# Altium footprint library En.PcbLib: 240 footprints (part 5 of 15)
Each footprint in its own frame and in the unit in brackets; x right, y up, seen from the top. Pads: shape width x height; smd on the part's side, far side on the other; paste and mask are expansions set on the pad; w line width, h text height; cw(c..) or ccw(c..) is an arc to the next point about the centre after c.
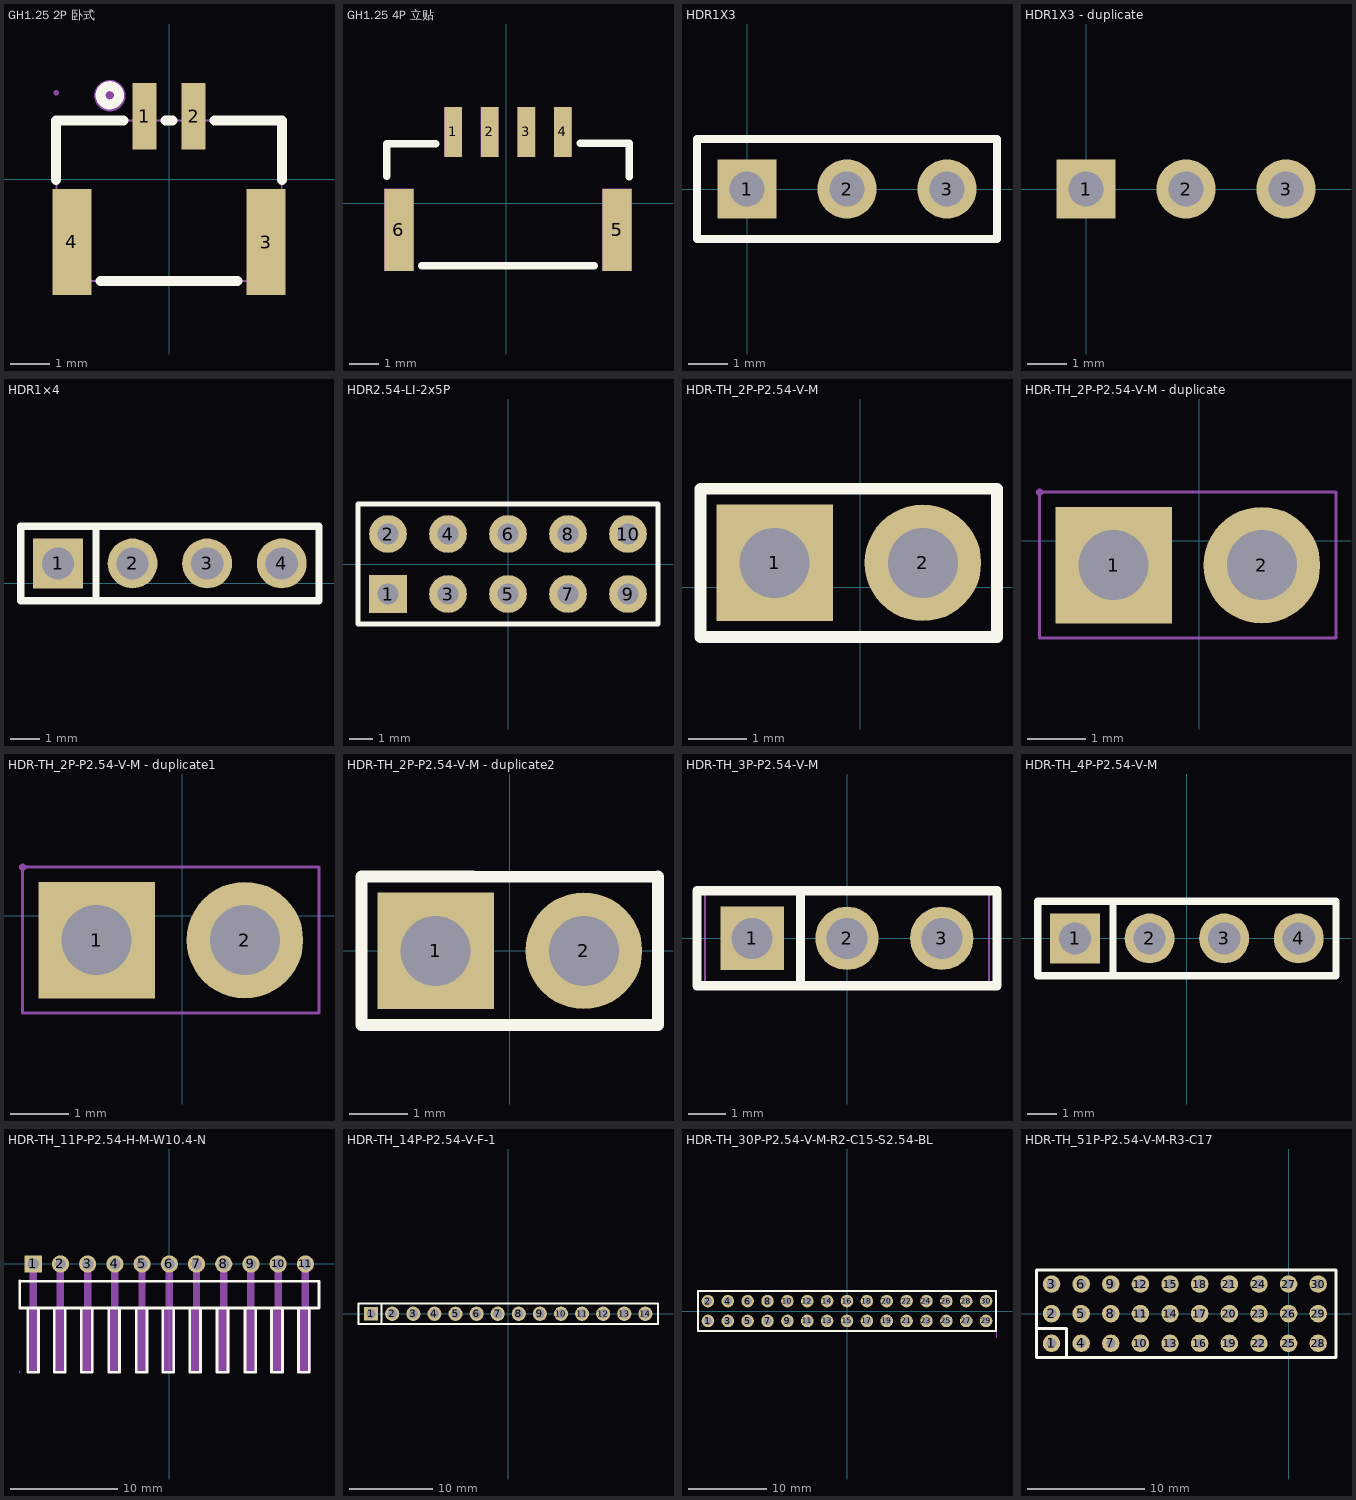
[diagram p4: the footprints below, top view; thin cyan lines are the x and y axes]

## GH1.25 2P 卧式 [mm]
pads (4):
  rect 0.6x1.7 smd mask+0.051: 1(-0.625,1.602) 2(0.625,1.602)
  rect 1x2.7 smd mask+0.051: 3(2.475,-1.602) 4(-2.475,-1.598)
Top Overlay:
  circle w0.254: c-1.51,2.14 r0.233
  lines w0.254: -2.88,-0.017 -2.88,1.5 -1.156,1.5 ; -1.744,-2.6 1.744,-2.6 ; -0.094,1.5 0.094,1.5 ; 1.156,1.5 2.88,1.5 2.88,-0.021
Mechanical 6:
  circle w0.4: c-1.51,2.13 r0.2
Mechanical 15:
  region: -2.575,-0.598 -2.375,-0.598 -2.375,-2.598 -2.575,-2.598
  region: 2.375,-0.602 2.575,-0.602 2.575,-2.602 2.375,-2.602
  region: -0.725,2.202 -0.525,2.202 -0.525,1.002 -0.725,1.002
  region: 0.525,2.202 0.725,2.202 0.725,1.002 0.525,1.002
  region: -2.815,2.202 -2.815,2.227 -2.85,2.262 -2.9,2.262 -2.935,2.227 -2.935,2.202 -2.935,2.177 -2.9,2.142 -2.85,2.142 -2.815,2.177 -2.815,2.202
  lines w0.051: -2.875,-2.598 2.875,-2.598 2.875,1.502 -2.875,1.502 -2.875,-2.598
3D body "User Library-GH-2-90.STEP": height 4.13, standoff -0.02, extent -2.88,-2.506 2.88,2.046

## GH1.25 4P 立贴 [mm]
pads (6):
  rect 0.6x1.7 smd: 1(-1.809,2.44) 2(-0.559,2.44) 3(0.691,2.44) 4(1.941,2.44)
  rect 1x2.8 smd: 5(3.791,-0.91) 6(-3.659,-0.91)
Top Overlay:
  lines w0.254: -4.084,0.92 -4.084,2.04 -2.404,2.04 ; -2.884,-2.13 3.016,-2.13 ; 2.535,2.054 4.217,2.054 ; 4.216,0.9 4.216,2.04
Mechanical 5:
  region: 1.641,3.29 2.241,3.29 2.241,1.59 1.641,1.59
  region: -0.859,3.29 -0.259,3.29 -0.259,1.59 -0.859,1.59
  region: -2.109,3.29 -1.509,3.29 -1.509,1.59 -2.109,1.59
  region: 3.291,0.49 4.291,0.49 4.291,-2.31 3.291,-2.31
  region: -4.159,0.49 -3.159,0.49 -3.159,-2.31 -4.159,-2.31
  region: 0.391,3.29 0.991,3.29 0.991,1.59 0.391,1.59
3D body "User Library-GH-4-180.sldprt": height 4.22, standoff 0.02, extent -4.13,-2.157 4.13,2.793

## HDR1X3 [mm] "Connector; Header; 3 Position"
pads (3):
  rect 1.5x1.5 hole 0.9: 1(0,0)
  round 1.5 hole 0.9: 2(2.54,0) 3(5.08,0)
Top Overlay:
  lines w0.2: -1.27,-1.27 6.35,-1.27 6.35,1.27 -1.27,1.27 -1.27,-1.27

## HDR1X3 - duplicate [mm] "Connector; Header; 3 Position"
pads (3):
  rect 1.5x1.5 hole 0.9: 1(0,0)
  round 1.5 hole 0.9: 2(2.54,0) 3(5.08,0)
Bottom Overlay:
  lines w0.2: -1.27,-1.27 6.35,-1.27 6.35,1.27 -1.27,1.27 -1.27,-1.27

## HDR1×4 [mm]
pads (4):
  rect 1.7x1.7 hole 1.1: 1(27.492,0.675)
  round 1.7 hole 1.1: 2(30.032,0.675) 3(32.572,0.675) 4(35.112,0.675)
Top Overlay:
  lines w0.254: 28.785,-0.595 28.785,1.945 ; 28.785,1.945 26.222,1.945 26.222,-0.595 36.382,-0.595 36.382,1.945 28.785,1.945
Mechanical 15:
  region: 34.792,0.995 35.432,0.995 35.432,0.355 34.792,0.355
  region: 32.252,0.995 32.892,0.995 32.892,0.355 32.252,0.355
  region: 29.712,0.995 30.352,0.995 30.352,0.355 29.712,0.355
  region: 27.172,0.995 27.812,0.995 27.812,0.355 27.172,0.355
  region: 26.282,-0.575 26.282,-0.55 26.247,-0.515 26.197,-0.515 26.162,-0.55 26.162,-0.575 26.162,-0.6 26.197,-0.635 26.247,-0.635 26.282,-0.6
  lines w0.051: 26.222,-0.575 36.382,-0.575 36.382,1.925 26.222,1.925 26.222,-0.575

## HDR2.54-LI-2x5P [mm] "双排排针，5x2脚"
pads (10):
  rect 1.6x1.6 hole 0.9: 1(-5.08,-1.27)
  round 1.6 hole 0.9: 2(-5.08,1.27) 3(-2.54,-1.27) 4(-2.54,1.27) 5(0,-1.27) 6(0,1.27) 7(2.54,-1.27) 8(2.54,1.27) 9(5.08,-1.27) 10(5.08,1.27)
Top Overlay:
  lines w0.2: -6.35,-2.54 6.35,-2.54 6.35,2.54 -6.35,2.54 -6.35,-2.54
3D body "HDR2.54-1x2P.STEP": height 8.5, standoff -3, extent 3.81,-2.54 6.35,2.54
3D body "HDR2.54-1x2P.STEP": height 8.5, standoff -3, extent -3.81,-2.54 -1.27,2.54
3D body "HDR2.54-1x2P.STEP": height 8.5, standoff -3, extent -6.35,-2.54 -3.81,2.54
3D body "HDR2.54-1x2P.STEP": height 8.5, standoff -3, extent 1.27,-2.54 3.81,2.54
3D body "HDR2.54-1x2P.STEP": height 8.5, standoff -3, extent -1.27,-2.54 1.27,2.54

## HDR-TH_2P-P2.54-V-M [mm]
pads (2):
  rect 2x2 hole 1.2: 1(-1.464,0.421)
  round 2 hole 1.2: 2(1.076,0.421)
Top Overlay:
  lines w0.203: -2.734,-0.849 2.346,-0.849 2.346,1.691 -0.829,1.691 -2.734,1.691 -2.734,-0.849
Mechanical 15:
  region: -2.674,-0.829 -2.674,-0.804 -2.709,-0.769 -2.759,-0.769 -2.794,-0.804 -2.794,-0.829 -2.794,-0.854 -2.759,-0.889 -2.709,-0.889 -2.674,-0.854
  region: 0.756,0.741 1.396,0.741 1.396,0.101 0.756,0.101
  region: -1.784,0.741 -1.144,0.741 -1.144,0.101 -1.784,0.101
  lines w0.051: -2.734,-0.829 -2.734,1.671 2.346,1.671 2.346,-0.829 -2.734,-0.829
3D body "pz254v-11-02p.step": height 8.5, standoff -3, extent -2.734,-0.849 2.356,1.691

## HDR-TH_2P-P2.54-V-M - duplicate [mm]
pads (2):
  rect 2x2 hole 1.2: 1(-1.464,-0.421)
  round 2 hole 1.2: 2(1.076,-0.421)
Bottom Overlay:
  lines w0.203: -2.734,-1.691 -2.734,0.849 2.346,0.849 2.346,-1.691 -0.829,-1.691 -2.734,-1.691
Mechanical 15:
  region: 0.756,-0.741 1.396,-0.741 1.396,-0.101 0.756,-0.101
  region: -1.784,-0.741 -1.144,-0.741 -1.144,-0.101 -1.784,-0.101
  region: -2.674,0.829 -2.674,0.804 -2.709,0.769 -2.759,0.769 -2.794,0.804 -2.794,0.829 -2.794,0.854 -2.759,0.889 -2.709,0.889 -2.674,0.854
  lines w0.051: -2.734,-1.671 -2.734,0.829 2.346,0.829 2.346,-1.671 -2.734,-1.671

## HDR-TH_2P-P2.54-V-M - duplicate1 [mm]
pads (2):
  rect 2x2 hole 1.2: 1(-1.464,-0.421)
  round 2 hole 1.2: 2(1.076,-0.421)
Bottom Overlay:
  lines w0.203: -2.734,-1.691 -2.734,0.849 2.346,0.849 2.346,-1.691 -0.829,-1.691 -2.734,-1.691
Mechanical 15:
  region: 0.756,-0.741 1.396,-0.741 1.396,-0.101 0.756,-0.101
  region: -1.784,-0.741 -1.144,-0.741 -1.144,-0.101 -1.784,-0.101
  region: -2.674,0.829 -2.674,0.804 -2.709,0.769 -2.759,0.769 -2.794,0.804 -2.794,0.829 -2.794,0.854 -2.759,0.889 -2.709,0.889 -2.674,0.854
  lines w0.051: -2.734,-1.671 -2.734,0.829 2.346,0.829 2.346,-1.671 -2.734,-1.671

## HDR-TH_2P-P2.54-V-M - duplicate2 [mm]
pads (2):
  rect 2x2 hole 1.2: 1(-1.27,0)
  round 2 hole 1.2: 2(1.27,0)
Top Overlay:
  lines w0.203: -2.54,-1.27 -2.54,1.27 -0.635,1.27 2.54,1.27 2.54,-1.27 -2.54,-1.27
Mechanical 15:
  region: -1.59,0.32 -0.95,0.32 -0.95,-0.32 -1.59,-0.32
  region: 0.95,0.32 1.59,0.32 1.59,-0.32 0.95,-0.32
  region: -2.48,-1.25 -2.48,-1.225 -2.515,-1.19 -2.565,-1.19 -2.6,-1.225 -2.6,-1.25 -2.6,-1.275 -2.565,-1.31 -2.515,-1.31 -2.48,-1.275
  lines w0.051: -2.54,-1.25 2.54,-1.25 2.54,1.25 -2.54,1.25 -2.54,-1.25

## HDR-TH_3P-P2.54-V-M [mm]
pads (3):
  rect 1.7x1.7 hole 1.1: 1(-2.54,0)
  round 1.7 hole 1.1: 2(0,0) 3(2.54,0)
Top Overlay:
  lines w0.254: -1.246,-1.27 -1.246,1.27 ; -4.02,-1.27 -4.02,1.27 4.02,1.27 4.02,-1.27 -4.02,-1.27
Mechanical 15:
  region: -2.86,0.32 -2.22,0.32 -2.22,-0.32 -2.86,-0.32
  region: -0.32,0.32 0.32,0.32 0.32,-0.32 -0.32,-0.32
  region: 2.22,0.32 2.86,0.32 2.86,-0.32 2.22,-0.32
  region: -3.75,-1.25 -3.751,-1.226 -3.786,-1.192 -3.834,-1.192 -3.869,-1.226 -3.87,-1.25 -3.869,-1.274 -3.834,-1.308 -3.786,-1.308 -3.751,-1.274
  lines w0.051: -3.81,-1.25 3.81,-1.25 3.81,1.25 -3.81,1.25 -3.81,-1.25
3D body "User Library-1x3 TH Pitch 2_54mm (1).SLDPRT": height 9.5, standoff -3.2, extent -3.81,-1.27 3.81,1.27

## HDR-TH_4P-P2.54-V-M [mm]
pads (4):
  rect 1.7x1.7 hole 1.1: 1(-3.81,0)
  round 1.7 hole 1.1: 2(-1.27,0) 3(1.27,0) 4(3.81,0)
Top Overlay:
  lines w0.254: -2.516,-1.27 -2.516,1.27 ; -2.516,1.27 -5.08,1.27 -5.08,-1.27 5.08,-1.27 5.08,1.27 -2.516,1.27
Mechanical 15:
  region: 3.49,0.32 4.13,0.32 4.13,-0.32 3.49,-0.32
  region: 0.95,0.32 1.59,0.32 1.59,-0.32 0.95,-0.32
  region: -1.59,0.32 -0.95,0.32 -0.95,-0.32 -1.59,-0.32
  region: -4.13,0.32 -3.49,0.32 -3.49,-0.32 -4.13,-0.32
  region: -5.02,-1.25 -5.02,-1.225 -5.055,-1.19 -5.105,-1.19 -5.14,-1.225 -5.14,-1.25 -5.14,-1.275 -5.105,-1.31 -5.055,-1.31 -5.02,-1.275
  lines w0.051: -5.08,-1.25 5.08,-1.25 5.08,1.25 -5.08,1.25 -5.08,-1.25

## HDR-TH_11P-P2.54-H-M-W10.4-N [mm]
pads (11):
  rect 1.6x1.6 hole 1.05: 1(-12.7,0)
  round 1.6 hole 1.05: 2(-10.16,0) 3(-7.62,0) 4(-5.08,0) 5(-2.54,0) 6(0,0) 7(2.54,0) 8(5.08,0) 9(7.62,0) 10(10.16,0) 11(12.7,0)
Top Overlay:
  lines w0.254: -13.216,-4.1 -13.216,-10.1 -12.2,-10.1 -12.2,-4.1 ; -10.732,-4.1 -10.732,-10.1 -9.716,-10.1 -9.716,-4.1 ; -8.219,-4.1 -8.219,-10.1 -7.203,-10.1 -7.203,-4.1 ; -5.666,-4.1 -5.666,-10.1 -4.65,-10.1 -4.65,-4.1 ; -3.093,-4.1 -3.093,-10.1 -2.077,-10.1 -2.077,-4.1 ; -0.609,-4.1 -0.609,-10.1 0.407,-10.1 0.407,-4.1 ; 1.904,-4.1 1.904,-10.1 2.92,-10.1 2.92,-4.1 ; 4.456,-4.1 4.456,-10.1 5.472,-10.1 5.472,-4.1 ; 7.053,-4.1 7.053,-10.1 8.069,-10.1 8.069,-4.1 ; 9.537,-4.1 9.537,-10.1 10.553,-10.1 10.553,-4.1 ; 12.05,-4.1 12.05,-10.1 13.066,-10.1 13.066,-4.1 ; -13.97,-4.099 -13.97,-1.599 13.97,-1.6 13.97,-4.1 -13.97,-4.099
Mechanical 6:
  region: 12.2,-4.1 13.2,-4.1 13.2,-10 12.2,-10 12.2,-9.8
  region: 9.66,-4.1 10.66,-4.1 10.66,-10 9.66,-10 9.66,-9.8
  region: 7.12,-4.1 8.12,-4.1 8.12,-10 7.12,-10 7.12,-9.8
  region: 4.58,-4.1 5.58,-4.1 5.58,-10 4.58,-10 4.58,-9.8
  region: 2.04,-4.1 3.04,-4.1 3.04,-10 2.04,-10 2.04,-9.8
  region: -0.5,-4.1 0.5,-4.1 0.5,-10 -0.5,-10 -0.5,-9.8
  region: -3.04,-4.1 -2.04,-4.1 -2.04,-10 -3.04,-10 -3.04,-9.8
  region: -5.58,-4.1 -4.58,-4.1 -4.58,-10 -5.58,-10 -5.58,-9.8
  region: -8.12,-4.1 -7.12,-4.1 -7.12,-10 -8.12,-10 -8.12,-9.8
  region: -10.66,-4.1 -9.66,-4.1 -9.66,-10 -10.66,-10 -10.66,-9.8
  region: -13.2,-4.1 -12.2,-4.1 -12.2,-10 -13.2,-10 -13.2,-9.8
Mechanical 15:
  region: 12.377,-10.078 12.377,0.322 13.017,0.322 13.017,-10.078
  region: 9.837,-10.078 9.837,0.322 10.477,0.322 10.477,-10.078
  region: 7.297,-10.078 7.297,0.322 7.937,0.322 7.937,-10.078
  region: 4.757,-10.078 4.757,0.322 5.397,0.322 5.397,-10.078
  region: 2.217,-10.078 2.217,0.322 2.857,0.322 2.857,-10.078
  region: -0.323,-10.078 -0.323,0.322 0.317,0.322 0.317,-10.078
  region: -2.863,-10.078 -2.863,0.322 -2.223,0.322 -2.223,-10.078
  region: -5.403,-10.078 -5.403,0.322 -4.763,0.322 -4.763,-10.078
  region: -7.943,-10.078 -7.943,0.322 -7.303,0.322 -7.303,-10.078
  region: -10.483,-10.078 -10.483,0.322 -9.843,0.322 -9.843,-10.078
  region: -13.023,-10.078 -13.023,0.322 -12.383,0.322 -12.383,-10.078
  region: -13.02,0.32 -12.38,0.32 -12.38,-0.32 -13.02,-0.32
  region: -10.48,0.32 -9.84,0.32 -9.84,-0.32 -10.48,-0.32
  region: -7.94,0.32 -7.3,0.32 -7.3,-0.32 -7.94,-0.32
  region: -5.4,0.32 -4.76,0.32 -4.76,-0.32 -5.4,-0.32
  region: -2.86,0.32 -2.22,0.32 -2.22,-0.32 -2.86,-0.32
  region: -0.32,0.32 0.32,0.32 0.32,-0.32 -0.32,-0.32
  region: 2.22,0.32 2.86,0.32 2.86,-0.32 2.22,-0.32
  region: 4.76,0.32 5.4,0.32 5.4,-0.32 4.76,-0.32
  region: 7.3,0.32 7.94,0.32 7.94,-0.32 7.3,-0.32
  region: 9.84,0.32 10.48,0.32 10.48,-0.32 9.84,-0.32
  region: 12.38,0.32 13.02,0.32 13.02,-0.32 12.38,-0.32
  region: -13.91,-10.078 -13.91,-10.053 -13.945,-10.018 -13.995,-10.018 -14.03,-10.053 -14.03,-10.078 -14.03,-10.103 -13.995,-10.138 -13.945,-10.138 -13.91,-10.103
  lines w0.051: -13.97,-4.1 13.97,-4.1 13.97,-1.6 -13.97,-1.6 -13.97,-4.1
3D body "pz254-1-11-w-8.5.step": height 1.26, standoff -4.25, extent -14.02,-10.1 13.92,0.3

## HDR-TH_14P-P2.54-V-F-1 [mm]
pads (14):
  rect 1.7x1.575 hole 1.1: 1(-16.51,0)
  round 1.7 hole 1.1: 2(-13.97,0) 3(-11.43,0) 4(-8.89,0) 5(-6.35,0) 6(-3.81,0) 7(-1.27,0) 8(1.27,0) 9(3.81,0) 10(6.35,0) 11(8.89,0) 12(11.43,0) 13(13.97,0) 14(16.51,0)
Top Overlay:
  lines w0.254: -15.24,-1.25 -15.24,1.25 ; -18.03,-1.25 -18.03,1.25 18.03,1.25 18.03,-1.25 -18.03,-1.25
Mechanical 15:
  region: 16.21,0.1 16.81,0.1 16.81,-0.1 16.21,-0.1
  region: 13.67,0.1 14.27,0.1 14.27,-0.1 13.67,-0.1
  region: 11.13,0.1 11.73,0.1 11.73,-0.1 11.13,-0.1
  region: 8.59,0.1 9.19,0.1 9.19,-0.1 8.59,-0.1
  region: 6.05,0.1 6.65,0.1 6.65,-0.1 6.05,-0.1
  region: 3.51,0.1 4.11,0.1 4.11,-0.1 3.51,-0.1
  region: 0.97,0.1 1.57,0.1 1.57,-0.1 0.97,-0.1
  region: -1.57,0.1 -0.97,0.1 -0.97,-0.1 -1.57,-0.1
  region: -4.11,0.1 -3.51,0.1 -3.51,-0.1 -4.11,-0.1
  region: -6.65,0.1 -6.05,0.1 -6.05,-0.1 -6.65,-0.1
  region: -9.19,0.1 -8.59,0.1 -8.59,-0.1 -9.19,-0.1
  region: -11.73,0.1 -11.13,0.1 -11.13,-0.1 -11.73,-0.1
  region: -14.27,0.1 -13.67,0.1 -13.67,-0.1 -14.27,-0.1
  region: -16.81,0.1 -16.21,0.1 -16.21,-0.1 -16.81,-0.1
  region: -17.97,-1.25 -17.97,-1.225 -18.005,-1.19 -18.055,-1.19 -18.09,-1.225 -18.09,-1.25 -18.09,-1.275 -18.055,-1.31 -18.005,-1.31 -17.97,-1.275
  lines w0.051: -18.03,-1.25 18.03,-1.25 18.03,1.25 -18.03,1.25 -18.03,-1.25
3D body "pm254-1-14-z-8.5.step": height 8.5, standoff -3.3, extent -17.99,-1.25 17.98,1.25

## HDR-TH_30P-P2.54-V-M-R2-C15-S2.54-BL [mm]
pads (30):
  round 1.6 hole 1.05: 1(-17.78,-1.27) 2(-17.78,1.27) 3(-15.24,-1.27) 4(-15.24,1.27) 5(-12.7,-1.27) 6(-12.7,1.27) 7(-10.16,-1.27) 8(-10.16,1.27) 9(-7.62,-1.27) 10(-7.62,1.27) 11(-5.08,-1.27) 12(-5.08,1.27) 13(-2.54,-1.27) 14(-2.54,1.27) 15(0,-1.27) 16(0,1.27) 17(2.54,-1.27) 18(2.54,1.27) 19(5.08,-1.27) 20(5.08,1.27) 21(7.62,-1.27) 22(7.62,1.27) 23(10.16,-1.27) 24(10.16,1.27) 25(12.7,-1.27) 26(12.7,1.27) 27(15.24,-1.27) 28(15.24,1.27) 29(17.78,-1.27) 30(17.78,1.27)
Top Overlay:
  lines w0.254: -19.05,-2.54 -19.05,2.54 19.05,2.54 19.05,-2.54 -19.05,-2.54
Mechanical 15:
  drawing of 32 lines, arcs and shapes, not listed
3D body "x6521wv-2x15h-c60d30.step": height 8.54, standoff -3, extent -19.06,-2.5 19.05,2.5

## HDR-TH_51P-P2.54-V-M-R3-C17 [mm]
pads (30):
  round 1.5 hole 0.84: 1(-20.32,-2.54) 2(-20.32,0) 3(-20.32,2.54) 4(-17.78,-2.54) 5(-17.78,0) 6(-17.78,2.54) 7(-15.24,-2.54) 8(-15.24,0) 9(-15.24,2.54) 10(-12.7,-2.54) 11(-12.7,0) 12(-12.7,2.54) 13(-10.16,-2.54) 14(-10.16,0) 15(-10.16,2.54) 16(-7.62,-2.54) 17(-7.62,0) 18(-7.62,2.54) 19(-5.08,-2.54) 20(-5.08,0) 21(-5.08,2.54) 22(-2.54,-2.54) 23(-2.54,0) 24(-2.54,2.54) 25(0,-2.54) 26(0,0) 27(0,2.54) 28(2.54,-2.54) 29(2.54,0) 30(2.54,2.54)
Top Overlay:
  lines w0.254: -21.59,-1.27 -19.05,-1.27 -19.055,-3.75 ; -21.59,-3.75 -21.59,3.75 4.064,3.75 4.064,-3.75 -21.59,-3.75
Mechanical 15:
  drawing of 35 lines, arcs and shapes, not listed